# Altium footprint library LukaLIBRARY.PcbLib: 772 footprints (part 33 of 49)
Each footprint in its own frame and in the unit in brackets; x right, y up, seen from the top. Pads: shape width x height; smd on the part's side, far side on the other; paste and mask are expansions set on the pad; w line width, h text height; cw(c..) or ccw(c..) is an arc to the next point about the centre after c.
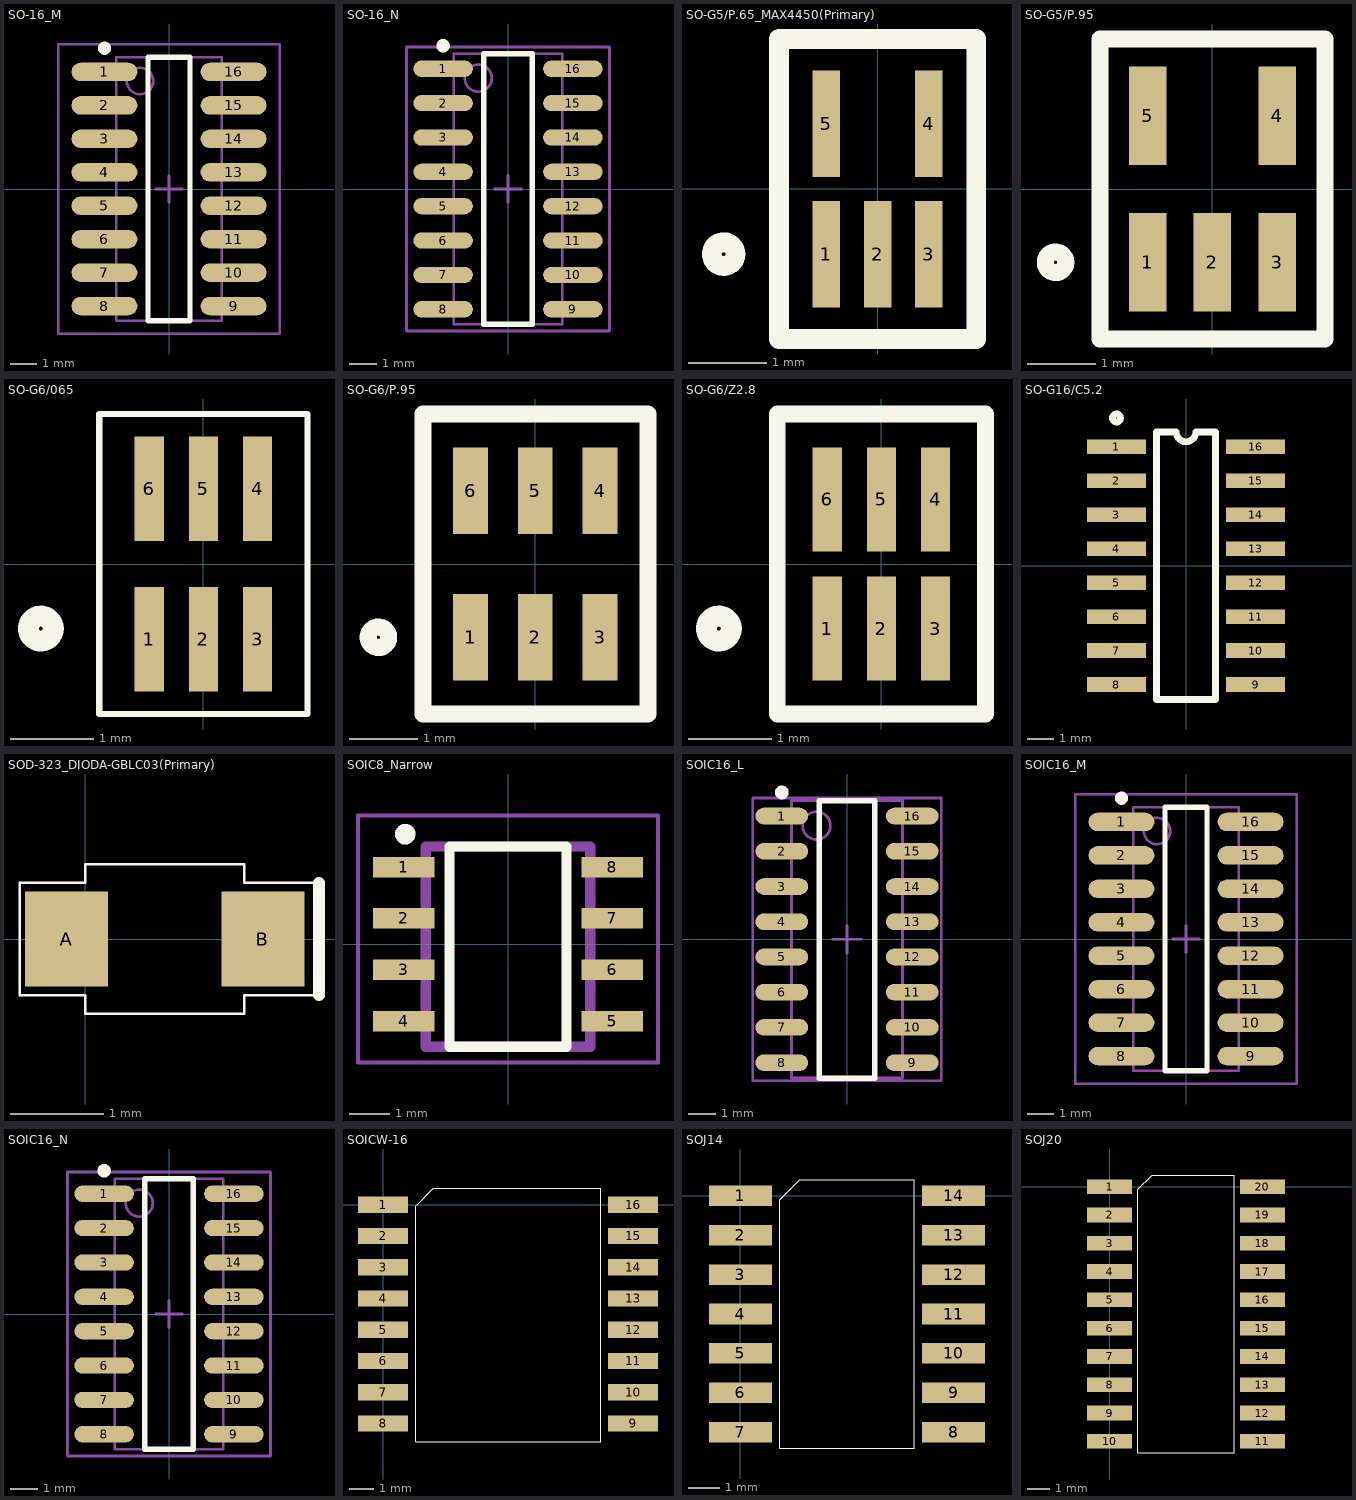
[diagram p32: the footprints below, top view; thin cyan lines are the x and y axes]

## SO-16_M [mm] "SOIC, 16-Leads, Body 9.9x3.9mm, Pitch 1.27mm, IPC Low Density"
height 1.75
pads (16):
  oval 2.5x0.7 smd: 1(-2.45,4.445) 2(-2.45,3.175) 3(-2.45,1.905) 4(-2.45,0.635) 5(-2.45,-0.635) 6(-2.45,-1.905) 7(-2.45,-3.175) 8(-2.45,-4.445) 9(2.45,-4.445) 10(2.45,-3.175) 11(2.45,-1.905) 12(2.45,-0.635) 13(2.45,0.635) 14(2.45,1.905) 15(2.45,3.175) 16(2.45,4.445)
Top Overlay:
  circle w0.25: c-2.45,5.345 r0.125
  lines w0.2: -0.8,-5 -0.8,5 0.8,5 0.8,-5 -0.8,-5
Mechanical 13:
  circle w0.1: c-1.1,4.1 r0.5
  lines w0.1: -2,-5 -2,5 2,5 2,-5 -2,-5
Mechanical 15:
  lines w0.1: -0.5,0 0.5,0 ; 0,-0.5 0,0.5 ; -4.2,-5.5 -4.2,5.5 4.2,5.5 4.2,-5.5 -4.2,-5.5
3D body: height 1.75, standoff 0, extent -2,-5 2,5

## SO-16_N [mm] "SOIC, 16-Leads, Body 9.9x3.9mm, Pitch 1.27mm, IPC Medium Density"
height 1.75
pads (16):
  oval 2.2x0.6 smd: 1(-2.4,4.445) 2(-2.4,3.175) 3(-2.4,1.905) 4(-2.4,0.635) 5(-2.4,-0.635) 6(-2.4,-1.905) 7(-2.4,-3.175) 8(-2.4,-4.445) 9(2.4,-4.445) 10(2.4,-3.175) 11(2.4,-1.905) 12(2.4,-0.635) 13(2.4,0.635) 14(2.4,1.905) 15(2.4,3.175) 16(2.4,4.445)
Top Overlay:
  circle w0.25: c-2.4,5.295 r0.125
  lines w0.2: -0.9,-5 0.9,-5 0.9,5 -0.9,5 -0.9,-5
Mechanical 13:
  circle w0.1: c-1.1,4.1 r0.5
  lines w0.1: -2,-5 2,-5 2,5 -2,5 -2,-5
Mechanical 15:
  lines w0.1: -0.5,0 0.5,0 ; 0,-0.5 0,0.5 ; -3.75,-5.25 3.75,-5.25 3.75,5.25 -3.75,5.25 -3.75,-5.25
3D body: height 1.75, standoff 0, extent -2,-5 2,5

## SO-G5/P.65_MAX4450(Primary) [mm]
pads (5):
  rect 0.35x1.35 smd: 1(-0.65,-0.825) 2(0,-0.825) 3(0.65,-0.825) 4(0.65,0.825) 5(-0.65,0.825)
Top Overlay:
  circle w0.25: c-1.95,-0.825 r0.15
  lines w0.25: -1.25,-1.9 1.25,-1.9 1.25,1.9 -1.25,1.9 -1.25,-1.9

## SO-G5/P.95 [mm]
pads (5):
  rect 0.55x1.45 smd: 1(-0.95,-1.075) 2(0,-1.075) 3(0.95,-1.075) 4(0.95,1.075) 5(-0.95,1.075)
Top Overlay:
  circle w0.25: c-2.3,-1.075 r0.15
  lines w0.25: -1.65,-2.2 1.65,-2.2 1.65,2.2 -1.65,2.2 -1.65,-2.2

## SO-G6/065 [mm]
pads (6):
  rect 0.35x1.25 smd: 1(-0.65,-0.902) 2(0,-0.902) 3(0.65,-0.902) 4(0.65,0.902) 5(0,0.902) 6(-0.65,0.902)
Top Overlay:
  circle w0.25: c-1.95,-0.775 r0.15
  lines w0.076: -1.25,-1.8 1.25,-1.8 1.25,1.8 -1.25,1.8 -1.25,-1.8

## SO-G6/P.95 [mm]
pads (6):
  rect 0.508x1.27 smd: 1(-0.95,-1.075) 2(0,-1.075) 3(0.95,-1.075) 4(0.95,1.075) 5(0,1.075) 6(-0.95,1.075)
Top Overlay:
  circle w0.25: c-2.3,-1.075 r0.15
  lines w0.25: -1.65,-2.2 1.65,-2.2 1.65,2.2 -1.65,2.2 -1.65,-2.2

## SO-G6/Z2.8 [mm]
pads (6):
  rect 0.35x1.25 smd: 1(-0.65,-0.775) 2(0,-0.775) 3(0.65,-0.775) 4(0.65,0.775) 5(0,0.775) 6(-0.65,0.775)
Top Overlay:
  circle w0.25: c-1.95,-0.775 r0.15
  lines w0.2: -1.25,-1.8 1.25,-1.8 1.25,1.8 -1.25,1.8 -1.25,-1.8

## SO-G16/C5.2 [mm]
pads (16):
  rect 2.2x0.55 smd: 1(-2.6,4.445) 2(-2.6,3.175) 3(-2.6,1.905) 4(-2.6,0.635) 5(-2.6,-0.635) 6(-2.6,-1.905) 7(-2.6,-3.175) 8(-2.6,-4.445) 9(2.6,-4.445) 10(2.6,-3.175) 11(2.6,-1.905) 12(2.6,-0.635) 13(2.6,0.635) 14(2.6,1.905) 15(2.6,3.175) 16(2.6,4.445)
Top Overlay:
  circle w0.25: c-2.6,5.52 r0.15
  lines w0.25: -1.1,-5 1.1,-5 1.1,5 0.367,5 cw(c0,5) -0.367,5 -1.1,5 -1.1,-5

## SOD-323_DIODA-GBLC03(Primary) [mil]
pads (2):
  rect 35x40 smd mask-1000: A(-7.87,0) B(74.8,0)
Top Overlay:
  lines w0.98: -27.56,-23.62 0,-23.62 0,-31.5 59.06,-31.5 66.93,-31.5 66.93,-23.62 98.43,-23.62 ; -27.56,23.62 0,23.62 0,31.5 66.93,31.5 66.93,23.62 98.43,23.62
  lines w1: -27.56,-23.62 -27.56,23.62
  lines w4.92: 98.43,-23.62 98.43,23.62
Top Solder:
  region: -25.37,-20 9.63,-20 9.63,20 -25.37,20
  region: 57.3,-20 92.3,-20 92.3,20 57.3,20

## SOIC8_Narrow [mil]
pads (8):
  rect 60x20 smd: 1(-101.5,75) 2(-101.5,25) 3(-101.5,-25) 4(-101.5,-75) 5(101.5,-75) 6(101.5,-25) 7(101.5,25) 8(101.5,75)
Top Overlay:
  circle w10: c-100,107 r5
  lines w10: -57,-100 57,-100 57,95 -57,95 -57,-100
Mechanical 13:
  lines w10: -80,-100 80,-100 80,95 -80,95 -80,-100
Mechanical 15:
  lines w3.94: -146,-115 146,-115 146,125 -146,125 -146,-115

## SOIC16_L [mm] "SOIC, 16-Leads, Body 9.9x3.9mm, Pitch 1.27mm, IPC High Density"
height 1.91
pads (16):
  oval 1.9x0.6 smd: 1(-2.35,4.445) 2(-2.35,3.175) 3(-2.35,1.905) 4(-2.35,0.635) 5(-2.35,-0.635) 6(-2.35,-1.905) 7(-2.35,-3.175) 8(-2.35,-4.445) 9(2.35,-4.445) 10(2.35,-3.175) 11(2.35,-1.905) 12(2.35,-0.635) 13(2.35,0.635) 14(2.35,1.905) 15(2.35,3.175) 16(2.35,4.445)
Top Overlay:
  circle w0.25: c-2.35,5.295 r0.125
  lines w0.2: -1,-5 1,-5 1,5 -1,5 -1,-5
Mechanical 13:
  circle w0.1: c-1.1,4.1 r0.5
  lines w0.1: -2,-5 2,-5 2,5 -2,5 -2,-5
Mechanical 15:
  lines w0.1: -0.5,0 0.5,0 ; 0,-0.5 0,0.5 ; -3.4,-5.1 3.4,-5.1 3.4,5.1 -3.4,5.1 -3.4,-5.1
3D body: height 1.91, standoff 0, extent -2,-5 2,5

## SOIC16_M [mm] "SOIC, 16-Leads, Body 9.9x3.9mm, Pitch 1.27mm, IPC Low Density"
height 1.91
pads (16):
  oval 2.5x0.7 smd: 1(-2.45,4.445) 2(-2.45,3.175) 3(-2.45,1.905) 4(-2.45,0.635) 5(-2.45,-0.635) 6(-2.45,-1.905) 7(-2.45,-3.175) 8(-2.45,-4.445) 9(2.45,-4.445) 10(2.45,-3.175) 11(2.45,-1.905) 12(2.45,-0.635) 13(2.45,0.635) 14(2.45,1.905) 15(2.45,3.175) 16(2.45,4.445)
Top Overlay:
  circle w0.25: c-2.45,5.345 r0.125
  lines w0.2: -0.8,-5 -0.8,5 0.8,5 0.8,-5 -0.8,-5
Mechanical 13:
  circle w0.1: c-1.1,4.1 r0.5
  lines w0.1: -2,-5 -2,5 2,5 2,-5 -2,-5
Mechanical 15:
  lines w0.1: -0.5,0 0.5,0 ; 0,-0.5 0,0.5 ; -4.2,-5.5 -4.2,5.5 4.2,5.5 4.2,-5.5 -4.2,-5.5
3D body: height 1.91, standoff 0, extent -2,-5 2,5

## SOIC16_N [mm] "SOIC, 16-Leads, Body 9.9x3.9mm, Pitch 1.27mm, IPC Medium Density"
height 1.91
pads (16):
  oval 2.2x0.6 smd: 1(-2.4,4.445) 2(-2.4,3.175) 3(-2.4,1.905) 4(-2.4,0.635) 5(-2.4,-0.635) 6(-2.4,-1.905) 7(-2.4,-3.175) 8(-2.4,-4.445) 9(2.4,-4.445) 10(2.4,-3.175) 11(2.4,-1.905) 12(2.4,-0.635) 13(2.4,0.635) 14(2.4,1.905) 15(2.4,3.175) 16(2.4,4.445)
Top Overlay:
  circle w0.25: c-2.4,5.295 r0.125
  lines w0.2: -0.9,-5 0.9,-5 0.9,5 -0.9,5 -0.9,-5
Mechanical 13:
  circle w0.1: c-1.1,4.1 r0.5
  lines w0.1: -2,-5 2,-5 2,5 -2,5 -2,-5
Mechanical 15:
  lines w0.1: -0.5,0 0.5,0 ; 0,-0.5 0,0.5 ; -3.75,-5.25 3.75,-5.25 3.75,5.25 -3.75,5.25 -3.75,-5.25
3D body: height 1.91, standoff 0, extent -2,-5 2,5

## SOICW-16 [mil]
pads (16):
  rect 80x26 smd mask-1000: 1(0,0) 2(0,-50) 3(0,-100) 4(0,-150) 5(0,-200) 6(0,-250) 7(0,-300) 8(0,-350) 9(400,-350) 10(400,-300) 11(400,-250) 12(400,-200) 13(400,-150) 14(400,-100) 15(400,-50) 16(400,0)
Top Overlay:
  lines w1: 52.76,-1.57 52.76,-379.53 348.03,-379.53 348.03,25.98 80.31,25.98 53.94,-1.06
Top Solder:
  region: 360,-113 440,-113 440,-87 360,-87
  region: 360,-13 440,-13 440,13 360,13
  region: 360,-63 440,-63 440,-37 360,-37
  region: 360,-163 440,-163 440,-137 360,-137
  region: 360,-213 440,-213 440,-187 360,-187
  region: 360,-263 440,-263 440,-237 360,-237
  region: 360,-313 440,-313 440,-287 360,-287
  region: 360,-363 440,-363 440,-337 360,-337
  region: -40,-113 40,-113 40,-87 -40,-87
  region: -40,-63 40,-63 40,-37 -40,-37
  region: -40,-13 40,-13 40,13 -40,13
  region: -40,-213 40,-213 40,-187 -40,-187
  region: -40,-163 40,-163 40,-137 -40,-137
  region: -40,-363 40,-363 40,-337 -40,-337
  region: -40,-313 40,-313 40,-287 -40,-287
  region: -40,-263 40,-263 40,-237 -40,-237

## SOJ14 [mil]
pads (14):
  rect 80x26 smd mask-1000: 1(0,0) 2(0,-50) 3(0,-100) 4(0,-150) 5(0,-200) 6(0,-250) 7(0,-300) 8(270,-300) 9(270,-250) 10(270,-200) 11(270,-150) 12(270,-100) 13(270,-50) 14(270,0)
Top Overlay:
  lines w1: 50,-320 50,-5 75,20 220,20 220,-320 50,-320
Top Solder:
  region: -40,-163 40,-163 40,-137 -40,-137
  region: -40,-213 40,-213 40,-187 -40,-187
  region: -40,-263 40,-263 40,-237 -40,-237
  region: -40,-313 40,-313 40,-287 -40,-287
  region: -40,-13 40,-13 40,13 -40,13
  region: -40,-63 40,-63 40,-37 -40,-37
  region: 230,-313 310,-313 310,-287 230,-287
  region: 230,-263 310,-263 310,-237 230,-237
  region: 230,-213 310,-213 310,-187 230,-187
  region: 230,-163 310,-163 310,-137 230,-137
  region: 230,-63 310,-63 310,-37 230,-37
  region: 230,-13 310,-13 310,13 230,13
  region: -40,-113 40,-113 40,-87 -40,-87
  region: 230,-113 310,-113 310,-87 230,-87

## SOJ20 [mil]
pads (20):
  rect 80x26 smd mask-1000: 1(0,0) 2(0,-50) 3(0,-100) 4(0,-150) 5(0,-200) 6(0,-250) 7(0,-300) 8(0,-350) 9(0,-400) 10(0,-450) 11(270,-450) 12(270,-400) 13(270,-350) 14(270,-300) 15(270,-250) 16(270,-200) 17(270,-150) 18(270,-100) 19(270,-50) 20(270,0)
Top Overlay:
  lines w1: 50,-470 50,-5 75,20 220,20 220,-470 50,-470
Top Solder:
  region: -40,-263 40,-263 40,-237 -40,-237
  region: -40,-313 40,-313 40,-287 -40,-287
  region: -40,-363 40,-363 40,-337 -40,-337
  region: -40,-413 40,-413 40,-387 -40,-387
  region: -40,-463 40,-463 40,-437 -40,-437
  region: -40,-13 40,-13 40,13 -40,13
  region: -40,-63 40,-63 40,-37 -40,-37
  region: -40,-113 40,-113 40,-87 -40,-87
  region: -40,-163 40,-163 40,-137 -40,-137
  region: 230,-463 310,-463 310,-437 230,-437
  region: 230,-413 310,-413 310,-387 230,-387
  region: 230,-363 310,-363 310,-337 230,-337
  region: 230,-313 310,-313 310,-287 230,-287
  region: 230,-263 310,-263 310,-237 230,-237
  region: 230,-163 310,-163 310,-137 230,-137
  region: 230,-113 310,-113 310,-87 230,-87
  region: 230,-63 310,-63 310,-37 230,-37
  region: 230,-13 310,-13 310,13 230,13
  region: -40,-213 40,-213 40,-187 -40,-187
  region: 230,-213 310,-213 310,-187 230,-187